# Altium footprint library ICs.PcbLib: 163 footprints (part 3 of 11)
Each footprint in its own frame and in the unit in brackets; x right, y up, seen from the top. Pads: shape width x height; smd on the part's side, far side on the other; paste and mask are expansions set on the pad; w line width, h text height; cw(c..) or ccw(c..) is an arc to the next point about the centre after c.
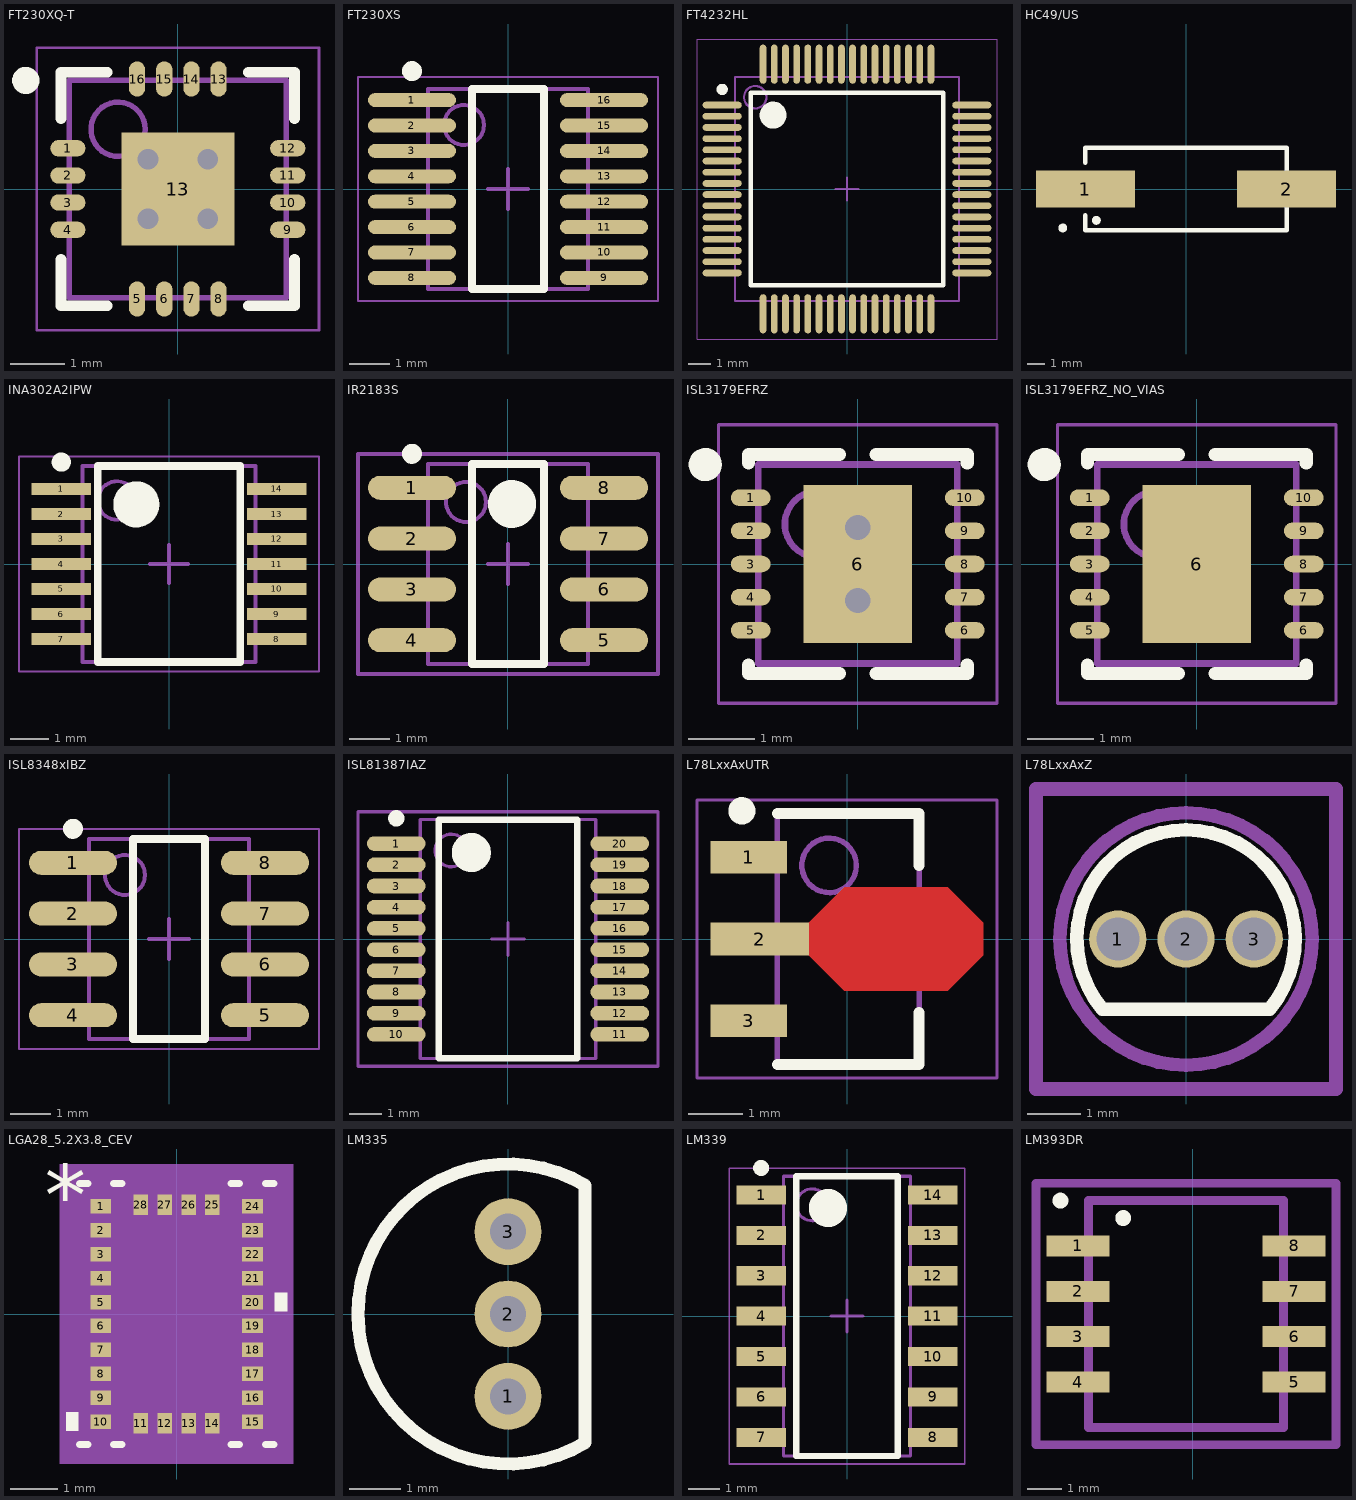
[diagram p2: the footprints below, top view; thin cyan lines are the x and y axes]

## FT230XQ-T [mm] "IC USB SERIAL BASIC UART 16QFN"
height 0.8
pads (17):
  oval 0.65x0.3 smd mask+0.07: 1(-2.025,0.75) 2(-2.025,0.25) 3(-2.025,-0.25) 4(-2.025,-0.75) 9(2.025,-0.75) 10(2.025,-0.25) 11(2.025,0.25) 12(2.025,0.75)
  oval 0.3x0.65 smd mask+0.07: 5(-0.75,-2.025) 6(-0.25,-2.025) 7(0.25,-2.025) 8(0.75,-2.025) 13(0.75,2.025) 14(0.25,2.025) 15(-0.25,2.025) 16(-0.75,2.025)
  rect 2.08x2.08 smd mask+0.07: 13(0,0)
via -0.55,0.55 diameter 0.762 hole 0.381
via 0.55,0.55 diameter 0.762 hole 0.381
via -0.55,-0.55 diameter 0.762 hole 0.381
via 0.55,-0.55 diameter 0.762 hole 0.381
Top Overlay:
  circle w0.25: c-2.8,2 r0.125
  lines w0.2: -2.15,-1.3 -2.15,-2.15 -1.3,-2.15 ; -2.15,1.3 -2.15,2.15 -1.3,2.15 ; 1.3,-2.15 2.15,-2.15 2.15,-1.3 ; 1.3,2.15 2.15,2.15 2.15,1.3
Mechanical 13:
  circle w0.1: c-1.1,1.1 r0.5
  lines w0.1: -2,-2 -2,2 2,2 2,-2 -2,-2
Mechanical 15:
  lines w0.05: -2.6,-2.6 -2.6,2.6 2.6,2.6 2.6,-2.6 -2.6,-2.6
  lines w0.1: -0.5,0 0.5,0 ; 0,-0.5 0,0.5
3D body: height 0.8, standoff 0, extent -2,-2 2,2

## FT230XS [mm] "SOP, 16-Leads, Body 4.90x3.90mm, Pitch 0.64mm, IPC Medium Density"
height 1.76
pads (16):
  oval 2.2x0.35 smd: 1(-2.4,2.222) 2(-2.4,1.587) 3(-2.4,0.953) 4(-2.4,0.318) 5(-2.4,-0.318) 6(-2.4,-0.953) 7(-2.4,-1.587) 8(-2.4,-2.222) 9(2.4,-2.222) 10(2.4,-1.587) 11(2.4,-0.953) 12(2.4,-0.318) 13(2.4,0.318) 14(2.4,0.953) 15(2.4,1.587) 16(2.4,2.222)
Top Overlay:
  circle w0.25: c-2.4,2.947 r0.125
  lines w0.2: -0.9,-2.5 0.9,-2.5 0.9,2.5 -0.9,2.5 -0.9,-2.5
Mechanical 13:
  circle w0.1: c-1.1,1.6 r0.5
  lines w0.1: -2,-2.5 2,-2.5 2,2.5 -2,2.5 -2,-2.5
Mechanical 15:
  lines w0.05: -3.75,-2.8 3.75,-2.8 3.75,2.8 -3.75,2.8 -3.75,-2.8
  lines w0.1: -0.5,0 0.5,0 ; 0,-0.5 0,0.5
3D body: height 1.76, standoff 0.1, extent -2,-2.5 2,2.5

## FT4232HL [mm] "TSQFP, 64-Leads, Body 10.00x10.00mm, Pitch 0.50mm, IPC Medium Density"
height 1.6
pads (64):
  oval 1.75x0.3 smd: 1(-5.575,3.75) 2(-5.575,3.25) 3(-5.575,2.75) 4(-5.575,2.25) 5(-5.575,1.75) 6(-5.575,1.25) 7(-5.575,0.75) 8(-5.575,0.25) 9(-5.575,-0.25) 10(-5.575,-0.75) 11(-5.575,-1.25) 12(-5.575,-1.75) 13(-5.575,-2.25) 14(-5.575,-2.75) 15(-5.575,-3.25) 16(-5.575,-3.75) 33(5.575,-3.75) 34(5.575,-3.25) 35(5.575,-2.75) 36(5.575,-2.25) 37(5.575,-1.75) 38(5.575,-1.25) 39(5.575,-0.75) 40(5.575,-0.25) 41(5.575,0.25) 42(5.575,0.75) 43(5.575,1.25) 44(5.575,1.75) 45(5.575,2.25) 46(5.575,2.75) 47(5.575,3.25) 48(5.575,3.75)
  oval 0.3x1.75 smd: 17(-3.75,-5.575) 18(-3.25,-5.575) 19(-2.75,-5.575) 20(-2.25,-5.575) 21(-1.75,-5.575) 22(-1.25,-5.575) 23(-0.75,-5.575) 24(-0.25,-5.575) 25(0.25,-5.575) 26(0.75,-5.575) 27(1.25,-5.575) 28(1.75,-5.575) 29(2.25,-5.575) 30(2.75,-5.575) 31(3.25,-5.575) 32(3.75,-5.575) 49(3.75,5.575) 50(3.25,5.575) 51(2.75,5.575) 52(2.25,5.575) 53(1.75,5.575) 54(1.25,5.575) 55(0.75,5.575) 56(0.25,5.575) 57(-0.25,5.575) 58(-0.75,5.575) 59(-1.25,5.575) 60(-1.75,5.575) 61(-2.25,5.575) 62(-2.75,5.575) 63(-3.25,5.575) 64(-3.75,5.575)
Top Overlay:
  circle w0.25: c-5.575,4.45 r0.125
  circle w0.6: c-3.3,3.3 r0.3
  lines w0.2: -4.3,-4.3 -4.3,4.3 4.3,4.3 4.3,-4.3 -4.3,-4.3
Mechanical 13:
  circle w0.1: c-4.1,4.1 r0.5
  lines w0.1: -5,-5 -5,5 5,5 5,-5 -5,-5
Mechanical 15:
  lines w0.05: -6.7,-6.7 -6.7,6.7 6.7,6.7 6.7,-6.7 -6.7,-6.7
  lines w0.1: -0.5,0 0.5,0 ; 0,-0.5 0,0.5
3D body: height 1.6, standoff 0.15, extent -5,-5 5,5

## HC49/US [mm]
height 3.3
pads (2):
  rect 5.6x2.1 smd: 1(-5.7,0) 2(5.7,0)
Top Overlay:
  circle w0.25: c-6.985,-2.21 r0.125
  circle w0.25: c-5.08,-1.778 r0.125
  lines w0.254: -5.7,-1.5 -5.7,-2.35 5.7,-2.35 5.7,2.35 -5.7,2.35 -5.7,1.5
3D body "ABLS2.stp": height 3.16, standoff -0.1, extent -6.35,-2.349 6.35,2.35

## INA302A2IPW [mm] "IC CURRENT SENSING AMP 14TSSOP"
height 1.2
pads (14):
  rect 1.55x0.3 smd: 1(-2.8,1.95) 2(-2.8,1.3) 3(-2.8,0.65) 4(-2.8,0) 5(-2.8,-0.65) 6(-2.8,-1.3) 7(-2.8,-1.95) 8(2.8,-1.95) 9(2.8,-1.3) 10(2.8,-0.65) 11(2.8,0) 12(2.8,0.65) 13(2.8,1.3) 14(2.8,1.95)
Top Overlay:
  circle w0.6: c-0.85,1.55 r0.3
  circle w0.25: c-2.8,2.65 r0.125
  lines w0.2: -1.85,-2.55 1.85,-2.55 1.85,2.55 -1.85,2.55 -1.85,-2.55
Mechanical 13:
  circle w0.1: c-1.35,1.65 r0.5
  lines w0.1: -2.25,-2.55 2.25,-2.55 2.25,2.55 -2.25,2.55 -2.25,-2.55
Mechanical 15:
  lines w0.05: -3.9,-2.8 3.9,-2.8 3.9,2.8 -3.9,2.8 -3.9,-2.8
  lines w0.1: -0.5,0 0.5,0 ; 0,-0.5 0,0.5
3D body: height 1.2, standoff 0.25, extent -2.25,-2.55 2.25,2.55

## IR2183S [mm]
pads (8):
  oval 2.2x0.6 smd: 1(-2.4,1.905) 2(-2.4,0.635) 3(-2.4,-0.635) 4(-2.4,-1.905) 5(2.4,-1.905) 6(2.4,-0.635) 7(2.4,0.635) 8(2.4,1.905)
Top Overlay:
  circle w0.6: c0.1,1.5 r0.3
  circle w0.25: c-2.4,2.755 r0.125
  lines w0.2: -0.9,-2.5 0.9,-2.5 0.9,2.5 -0.9,2.5 -0.9,-2.5
Mechanical 13:
  circle w0.1: c-1.05,1.55 r0.5
  lines w0.1: -2,-2.5 2,-2.5 2,2.5 -2,2.5 -2,-2.5
Mechanical 15:
  lines w0.1: -0.5,0 0.5,0 ; 0,-0.5 0,0.5 ; -3.75,-2.75 3.75,-2.75 3.75,2.75 -3.75,2.75 -3.75,-2.75
3D body: height 1.75, standoff 0.1, extent -2,-2.5 2,2.5

## ISL3179EFRZ [mm] "TXRX ESD 3.3V RS-485/422 10-DFN"
height 0.9
pads (11):
  oval 0.6x0.25 smd mask+0.07: 1(-1.615,1) 2(-1.615,0.5) 3(-1.615,0) 4(-1.615,-0.5) 5(-1.615,-1) 6(1.615,-1) 7(1.615,-0.5) 8(1.615,0) 9(1.615,0.5) 10(1.615,1)
  rect 1.64x2.38 smd mask+0.07: 6(0,0)
via 0,0.55 diameter 0.762 hole 0.381
via 0,-0.55 diameter 0.762 hole 0.381
Top Overlay:
  circle w0.25: c-2.3,1.5 r0.125
  lines w0.2: -1.65,-1.525 -1.65,-1.65 -0.275,-1.65 ; -1.65,1.525 -1.65,1.65 -0.275,1.65 ; 0.275,-1.65 1.65,-1.65 1.65,-1.525 ; 0.275,1.65 1.65,1.65 1.65,1.525
Mechanical 13:
  circle w0.1: c-0.6,0.6 r0.5
  lines w0.1: -1.5,-1.5 -1.5,1.5 1.5,1.5 1.5,-1.5 -1.5,-1.5
Mechanical 15:
  lines w0.05: -2.1,-2.1 -2.1,2.1 2.1,2.1 2.1,-2.1 -2.1,-2.1
  lines w0.1: -0.5,0 0.5,0 ; 0,-0.5 0,0.5
3D body: height 0.9, standoff 0.05, extent -1.5,-1.5 1.5,1.5

## ISL3179EFRZ_NO_VIAS [mm] "TXRX ESD 3.3V RS-485/422 10-DFN"
height 0.9
pads (11):
  oval 0.6x0.25 smd mask+0.07: 1(-1.615,1) 2(-1.615,0.5) 3(-1.615,0) 4(-1.615,-0.5) 5(-1.615,-1) 6(1.615,-1) 7(1.615,-0.5) 8(1.615,0) 9(1.615,0.5) 10(1.615,1)
  rect 1.64x2.38 smd mask+0.07: 6(0,0)
Top Overlay:
  circle w0.25: c-2.3,1.5 r0.125
  lines w0.2: -1.65,-1.525 -1.65,-1.65 -0.275,-1.65 ; -1.65,1.525 -1.65,1.65 -0.275,1.65 ; 0.275,-1.65 1.65,-1.65 1.65,-1.525 ; 0.275,1.65 1.65,1.65 1.65,1.525
Mechanical 13:
  circle w0.1: c-0.6,0.6 r0.5
  lines w0.1: -1.5,-1.5 1.5,-1.5 1.5,1.5 -1.5,1.5 -1.5,-1.5
Mechanical 15:
  lines w0.05: -2.1,-2.1 2.1,-2.1 2.1,2.1 -2.1,2.1 -2.1,-2.1
  lines w0.1: -0.5,0 0.5,0 ; 0,-0.5 0,0.5
3D body: height 0.9, standoff 0.05, extent -1.5,-1.5 1.5,1.5

## ISL8348xIBZ [mm] "SOIC, 8-Leads, Body 4.90x3.90mm, Pitch 1.27mm, IPC Medium Density"
height 1.35
pads (8):
  oval 2.2x0.6 smd: 1(-2.4,1.905) 2(-2.4,0.635) 3(-2.4,-0.635) 4(-2.4,-1.905) 5(2.4,-1.905) 6(2.4,-0.635) 7(2.4,0.635) 8(2.4,1.905)
Top Overlay:
  circle w0.25: c-2.4,2.755 r0.125
  lines w0.2: -0.9,-2.5 -0.9,2.5 0.9,2.5 0.9,-2.5 -0.9,-2.5
Mechanical 13:
  circle w0.1: c-1.1,1.6 r0.5
  lines w0.1: -2,-2.5 -2,2.5 2,2.5 2,-2.5 -2,-2.5
Mechanical 15:
  lines w0.05: -3.75,-2.75 -3.75,2.75 3.75,2.75 3.75,-2.75 -3.75,-2.75
  lines w0.1: -0.5,0 0.5,0 ; 0,-0.5 0,0.5
3D body: height 1.75, standoff 1.35, extent -2,-2.5 2,2.5

## ISL81387IAZ [mm] "SOP, 20-Leads, Body 7.3x5.4mm (max), Pitch 0.65mm, IPC Medium Density"
height 1.99
pads (20):
  oval 1.8x0.45 smd: 1(-3.425,2.925) 2(-3.425,2.275) 3(-3.425,1.625) 4(-3.425,0.975) 5(-3.425,0.325) 6(-3.425,-0.325) 7(-3.425,-0.975) 8(-3.425,-1.625) 9(-3.425,-2.275) 10(-3.425,-2.925) 11(3.425,-2.925) 12(3.425,-2.275) 13(3.425,-1.625) 14(3.425,-0.975) 15(3.425,-0.325) 16(3.425,0.325) 17(3.425,0.975) 18(3.425,1.625) 19(3.425,2.275) 20(3.425,2.925)
Top Overlay:
  circle w0.25: c-3.425,3.7 r0.125
  circle w0.6: c-1.125,2.65 r0.3
  lines w0.2: -2.125,-3.65 -2.125,3.65 2.125,3.65 2.125,-3.65 -2.125,-3.65
Mechanical 13:
  circle w0.1: c-1.74,2.715 r0.5
  lines w0.1: -2.69,-3.665 -2.69,3.665 2.69,3.665 2.69,-3.665 -2.69,-3.665
Mechanical 15:
  lines w0.1: -0.5,0 0.5,0 ; 0,-0.5 0,0.5 ; -4.6,-3.9 -4.6,3.9 4.6,3.9 4.6,-3.9 -4.6,-3.9
3D body: height 1.99, standoff 0.05, extent -2.69,-3.665 2.69,3.665

## L78LxxAxUTR [mm] "SOT89, 3-Leads, Body 4.50x2.45mm, Pitch 1.50mm, Lead Span 4.1mm, IPC Medium Density"
height 1.6
pads (3):
  rect 1.4x0.6 smd: 1(-1.8,1.5) 3(-1.8,-1.5)
  rect 1.8x0.6 smd: 2(-1.6,0)
Top Layer:
  region: -0.7,0.3 -0.05,0.95 1.85,0.95 2.5,0.3 2.5,-0.3 1.85,-0.95 -0.05,-0.95 -0.7,-0.3
Top Overlay:
  circle w0.25: c-1.927,2.35 r0.125
  lines w0.2: -1.278,-2.3 1.322,-2.3 1.322,-1.35 ; -1.278,2.3 1.322,2.3 1.322,1.35
Mechanical 13:
  circle w0.1: c-0.327,1.35 r0.5
  lines w0.1: -1.278,-2.3 1.322,-2.3 1.322,2.3 -1.278,2.3 -1.278,-2.3
Mechanical 15:
  lines w0.05: -2.75,-2.55 2.75,-2.55 2.75,2.55 -2.75,2.55 -2.75,-2.55
  lines w0.1: -0.477,0 0.523,0 ; 0.022,-0.5 0.022,0.5
3D body: height 1.6, standoff 0, extent -1.278,-2.3 1.322,2.3

## L78LxxAxZ [mil] "Positive voltage regulator TO-92"
pads (3):
  round 42 hole 31.5: 1(-50,0) 2(0,0) 3(50,0)
Top Overlay:
  lines w10: -61.28,-51.42 cw(c0,0) 61.28,-51.42 -61.28,-51.42
Mechanical 13:
  circle w10: c0,0 r92.52
Mechanical 15:
  lines w10: -110,-110 110,-110 110,110 -110,110 -110,-110
3D body: height 208.66, standoff 0, extent -91.78,-92.33 92.52,92.34

## LGA28_5.2X3.8_CEV [mil]
pads (28):
  rect 17x12 smd paste+0 mask+0: 1(-62.5,88.58) 2(-62.5,68.9) 3(-62.5,49.21) 4(-62.5,29.53) 5(-62.5,9.84) 6(-62.5,-9.84) 7(-62.5,-29.53) 8(-62.5,-49.21) 9(-62.5,-68.9) 10(-62.5,-88.58) 15(62.5,-88.58) 16(62.5,-68.9) 17(62.5,-49.21) 18(62.5,-29.53) 19(62.5,-9.84) 20(62.5,9.84) 21(62.5,29.53) 22(62.5,49.21) 23(62.5,68.9) 24(62.5,88.58)
  rect 12x17 smd paste+0 mask+0: 11(-29.53,-90) 12(-9.84,-90) 13(9.84,-90) 14(29.53,-90) 25(29.53,90) 26(9.84,90) 27(-9.84,90) 28(-29.53,90)
Top Overlay:
  region: 81,17.34 91,17.34 91,2.34 81,2.34
  region: -81,-81.08 -91,-81.08 -91,-96.08 -81,-96.08
  lines w6: -80,-107.5 -73.18,-107.5 ; -80,107.5 -73.18,107.5 ; -51.82,-107.5 -45.05,-107.5 ; -51.82,107.5 -45.05,107.5 ; 45.05,-107.5 51.82,-107.5 ; 45.05,107.5 51.82,107.5 ; 73.18,-107.5 80,-107.5 ; 73.18,107.5 80,107.5
  text "*" at -108.5,73.43 h50
Mechanical 5:
  region: 96,-123.5 -96,-123.5 -96,123.5 96,123.5
Mechanical 13:
  lines w1: -75,52.5 -25,102.5 ; -75,-102.5 -75,102.5 75,102.5 75,-102.5 -75,-102.5 ; -75,-94.58 -71,-94.58 -71,-82.58 -75,-82.58 -75,-94.58 ; -75,-74.9 -71,-74.9 -71,-62.9 -75,-62.9 -75,-74.9 ; -75,-55.21 -71,-55.21 -71,-43.21 -75,-43.21 -75,-55.21 ; -75,-35.53 -71,-35.53 -71,-23.53 -75,-23.53 -75,-35.53 ; -75,-15.84 -71,-15.84 -71,-3.84 -75,-3.84 -75,-15.84 ; -75,3.84 -71,3.84 -71,15.84 -75,15.84 -75,3.84 ; -75,23.53 -71,23.53 -71,35.53 -75,35.53 -75,23.53 ; -75,43.21 -71,43.21 -71,55.21 -75,55.21 -75,43.21 ; -75,62.9 -71,62.9 -71,74.9 -75,74.9 -75,62.9 ; -75,82.58 -71,82.58 -71,94.58 -75,94.58 -75,82.58 ; -35.53,-102.5 -35.53,-98.5 -23.53,-98.5 -23.53,-102.5 -35.53,-102.5 ; -35.53,98.5 -35.53,102.5 -23.53,102.5 -23.53,98.5 -35.53,98.5 ; -15.84,-102.5 -15.84,-98.5 -3.84,-98.5 -3.84,-102.5 -15.84,-102.5 ; -15.84,98.5 -15.84,102.5 -3.84,102.5 -3.84,98.5 -15.84,98.5 ; 3.84,-102.5 3.84,-98.5 15.84,-98.5 15.84,-102.5 3.84,-102.5 ; 3.84,98.5 3.84,102.5 15.84,102.5 15.84,98.5 3.84,98.5 ; 23.53,-102.5 23.53,-98.5 35.53,-98.5 35.53,-102.5 23.53,-102.5 ; 23.53,98.5 23.53,102.5 35.53,102.5 35.53,98.5 23.53,98.5 ; 71,-94.58 71,-82.58 75,-82.58 75,-94.58 71,-94.58 ; 71,-74.9 71,-62.9 75,-62.9 75,-74.9 71,-74.9 ; 71,-55.21 71,-43.21 75,-43.21 75,-55.21 71,-55.21 ; 71,-35.53 71,-23.53 75,-23.53 75,-35.53 71,-35.53 ; 71,-15.84 71,-3.84 75,-3.84 75,-15.84 71,-15.84 ; 71,3.84 71,15.84 75,15.84 75,3.84 71,3.84 ; 71,23.53 71,35.53 75,35.53 75,23.53 71,23.53 ; 71,43.21 71,55.21 75,55.21 75,43.21 71,43.21 ; 71,62.9 71,74.9 75,74.9 75,62.9 71,62.9 ; 71,82.58 71,94.58 75,94.58 75,82.58 71,82.58
  text "*" at -66.5,73.43 h50
Mechanical 15:
  region: -45.53,-112.5 -85,-112.5 -85,-104.58 -85,104.58 -85,112.5 -45.53,112.5 45.53,112.5 85,112.5 85,104.58 85,-104.58 85,-112.5 45.53,-112.5
  lines w6: -85,-112.5 -45.53,-112.5 45.53,-112.5 85,-112.5 85,-104.58 85,104.58 85,112.5 45.53,112.5 -45.53,112.5 -85,112.5 -85,104.58 -85,-104.58 -85,-112.5
3D body: height 10, standoff 0, extent 0,0 10,10

## LM335 [mm] "IC SENSOR PRECISION TEMP TO92-3"
height 5.5
pads (3):
  round 1.3 hole 0.7: 1(0,-1.6) 2(0,0) 3(0,1.6)
Top Overlay:
  lines w0.254: 1.5,-2.5 cw(c0,0) 1.5,2.5 1.5,-2.5
3D body: height 5.4, standoff 0, extent -2.9,-2.9 1.5,2.9

## LM339 [mm] "SOIC, 14-Leads, Body 8.65x3.90mm, Pitch 1.27mm, IPC Medium Density"
height 1.75
pads (14):
  rect 1.55x0.6 smd: 1(-2.7,3.81) 2(-2.7,2.54) 3(-2.7,1.27) 4(-2.7,0) 5(-2.7,-1.27) 6(-2.7,-2.54) 7(-2.7,-3.81) 8(2.7,-3.81) 9(2.7,-2.54) 10(2.7,-1.27) 11(2.7,0) 12(2.7,1.27) 13(2.7,2.54) 14(2.7,3.81)
Top Overlay:
  circle w0.25: c-2.7,4.66 r0.125
  circle w0.6: c-0.6,3.4 r0.3
  lines w0.2: -1.6,-4.4 -1.6,4.4 1.6,4.4 1.6,-4.4 -1.6,-4.4
Mechanical 13:
  circle w0.1: c-1.1,3.5 r0.5
  lines w0.1: -2,-4.4 -2,4.4 2,4.4 2,-4.4 -2,-4.4
Mechanical 15:
  lines w0.05: -3.7,-4.65 -3.7,4.65 3.7,4.65 3.7,-4.65 -3.7,-4.65
  lines w0.1: -0.5,0 0.5,0 ; 0,-0.5 0,0.5
3D body: height 1.75, standoff 0.1, extent -2,-4.4 2,4.4

## LM393DR [mm]
height 2
pads (8):
  rect 1.8x0.6 smd: 1(-3.3,-3.8) 2(-3.3,-5.1) 3(-3.3,-6.4) 4(-3.3,-7.7) 5(2.9,-7.7) 6(2.9,-6.4) 7(2.9,-5.1) 8(2.9,-3.8)
Top Overlay:
  circle w0.254: c-3.8,-2.5 r0.1
  circle w0.254: c-2,-3 r0.1
Mechanical 13:
  lines w0.254: -3,-9 -3,-2.5 2.6,-2.5 2.6,-9 -3,-9
Mechanical 15:
  lines w0.254: -4.5,-9.5 -4.5,-2 4.1,-2 4.1,-9.5 -4.5,-9.5
3D body: height 2, standoff 0, extent -3.1,-9.1 2.7,-2.4